# Altium footprint library MOLEX THD.PcbLib: 57 footprints (part 4 of 4)
Each footprint in its own frame and in the unit in brackets; x right, y up, seen from the top. Pads: shape width x height; smd on the part's side, far side on the other; paste and mask are expansions set on the pad; w line width, h text height; cw(c..) or ccw(c..) is an arc to the next point about the centre after c.
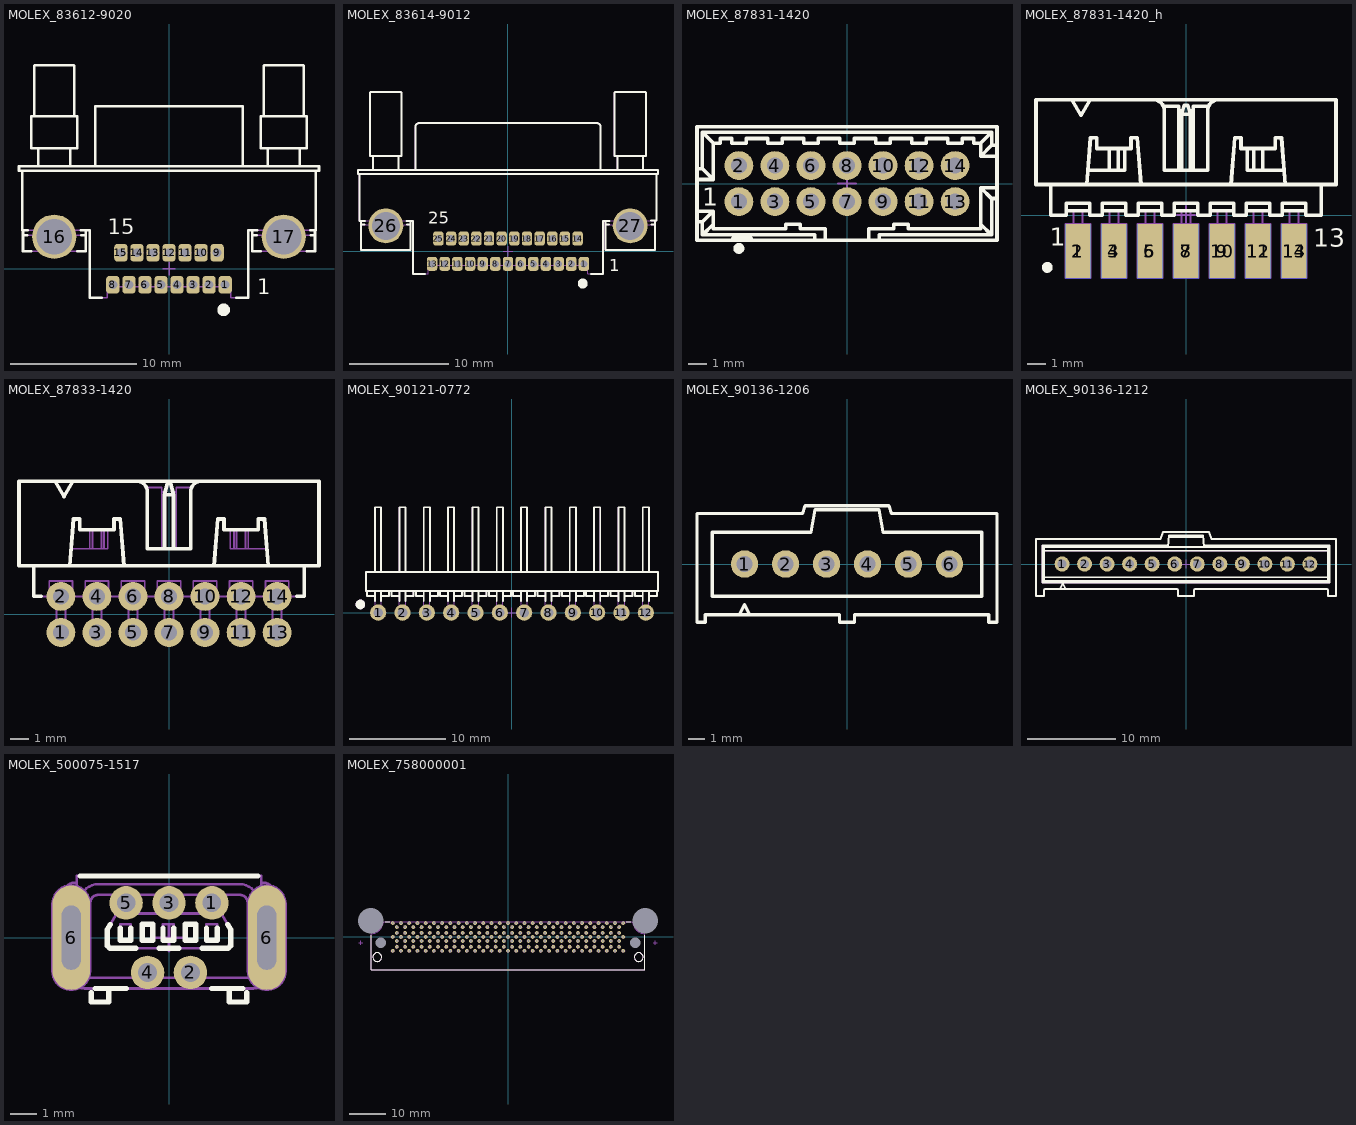
[diagram p3: the footprints below, top view; thin cyan lines are the x and y axes]

## MOLEX_83612-9020 [mm] "1.27mm Pitch Commercial Micro D, PCB Mount, Right Angle Plug, 15 Circuits"
height 7.82
pads (17):
  rrect50% 1.05x1.4 hole 0.7: 1(4.445,-1.27) 2(3.175,-1.27) 3(1.905,-1.27) 4(0.635,-1.27) 5(-0.635,-1.27) 6(-1.905,-1.27) 7(-3.175,-1.27) 8(-4.445,-1.27) 9(3.81,1.27) 10(2.54,1.27) 11(1.27,1.27) 12(0,1.27) 13(-1.27,1.27) 14(-2.54,1.27) 15(-3.81,1.27)
  round 3.5 hole 2.8: 16(-9.08,2.54) 17(9.08,2.54)
Top Overlay:
  circle w0.5: c4.325,-3.25 r0.25
  lines w0.2: -11.621,7.747 -11.621,3.048 -11.169,3.048 ; -11.557,2.667 -11.226,2.667 ; -11.557,3.048 -11.557,1.397 -10.901,1.397 ; -10.668,12.065 -10.668,16.053 -10.592,16.129 -7.569,16.129 -7.493,16.053 -7.493,12.065 ; -10.351,8.128 -10.351,9.525 ; -7.811,8.128 -7.811,9.525 ; -7.259,1.397 -6.604,1.397 -6.604,3.048 ; -6.991,3.048 -6.287,3.048 -6.287,-2.286 -5.32,-2.286 ; -6.934,2.667 -6.604,2.667 ; -5.842,8.128 -5.842,12.852 5.842,12.852 5.842,8.128 ; 5.32,-2.286 6.287,-2.286 6.287,3.048 6.991,3.048 ; 6.604,2.667 6.934,2.667 ; 6.604,3.048 6.604,1.397 7.259,1.397 ; 7.493,12.065 7.493,16.053 7.569,16.129 10.592,16.129 10.668,16.053 10.668,12.065 ; 7.811,8.128 7.811,9.525 ; 10.351,8.128 10.351,9.525 ; 10.901,1.397 11.557,1.397 11.557,3.048 ; 11.169,3.048 11.621,3.048 11.621,7.747 ; 11.226,2.667 11.557,2.667 ; -11.875,7.747 11.875,7.747 11.875,8.128 -11.875,8.128 -11.875,7.747 ; -10.914,9.525 -7.247,9.525 -7.247,12.065 -10.914,12.065 -10.914,9.525 ; 7.247,9.525 10.914,9.525 10.914,12.065 7.247,12.065 7.247,9.525
  text "15" at -4.85,2.735 h1.2
  text "1" at 7,-2.015 h1.2
Mechanical 8:
  lines w0.1: -9.58,2.54 -9.08,2.54 ; -9.08,2.04 -9.08,2.54 ; -9.08,3.04 -9.08,2.54 ; -8.58,2.54 -9.08,2.54 ; -4.945,-1.27 -4.445,-1.27 ; -4.445,-1.77 -4.445,-1.27 ; -4.445,-0.77 -4.445,-1.27 ; -4.31,1.27 -3.81,1.27 ; -3.945,-1.27 -4.445,-1.27 ; -3.81,0.77 -3.81,1.27 ; -3.81,1.77 -3.81,1.27 ; -3.675,-1.27 -3.175,-1.27 ; -3.31,1.27 -3.81,1.27 ; -3.175,-1.77 -3.175,-1.27 ; -3.175,-0.77 -3.175,-1.27 ; -3.04,1.27 -2.54,1.27 ; -2.675,-1.27 -3.175,-1.27 ; -2.54,0.77 -2.54,1.27 ; -2.54,1.77 -2.54,1.27 ; -2.405,-1.27 -1.905,-1.27 ; -2.04,1.27 -2.54,1.27 ; -1.905,-1.77 -1.905,-1.27 ; -1.905,-0.77 -1.905,-1.27 ; -1.77,1.27 -1.27,1.27 ; -1.405,-1.27 -1.905,-1.27 ; -1.27,0.77 -1.27,1.27 ; -1.27,1.77 -1.27,1.27 ; -1.135,-1.27 -0.635,-1.27 ; -0.77,1.27 -1.27,1.27 ; -0.635,-1.77 -0.635,-1.27 ; -0.635,-0.77 -0.635,-1.27 ; -0.5,0 0,0 ; -0.5,1.27 0,1.27 ; -0.135,-1.27 -0.635,-1.27 ; 0,-0.5 0,0 ; 0,0.5 0,0 ; 0,0.77 0,1.27 ; 0,1.77 0,1.27 ; 0.135,-1.27 0.635,-1.27 ; 0.5,0 0,0 ; 0.5,1.27 0,1.27 ; 0.635,-1.77 0.635,-1.27 ; 0.635,-0.77 0.635,-1.27 ; 0.77,1.27 1.27,1.27 ; 1.135,-1.27 0.635,-1.27 ; 1.27,0.77 1.27,1.27 ; 1.27,1.77 1.27,1.27 ; 1.405,-1.27 1.905,-1.27 ; 1.77,1.27 1.27,1.27 ; 1.905,-1.77 1.905,-1.27 ; 1.905,-0.77 1.905,-1.27 ; 2.04,1.27 2.54,1.27 ; 2.405,-1.27 1.905,-1.27 ; 2.54,0.77 2.54,1.27 ; 2.54,1.77 2.54,1.27 ; 2.675,-1.27 3.175,-1.27 ; 3.04,1.27 2.54,1.27 ; 3.175,-1.77 3.175,-1.27 ; 3.175,-0.77 3.175,-1.27 ; 3.31,1.27 3.81,1.27 ; 3.675,-1.27 3.175,-1.27 ; 3.81,0.77 3.81,1.27 ; 3.81,1.77 3.81,1.27 ; 3.945,-1.27 4.445,-1.27 ; 4.31,1.27 3.81,1.27 ; 4.445,-1.77 4.445,-1.27 ; 4.445,-0.77 4.445,-1.27 ; 4.945,-1.27 4.445,-1.27 ; 8.58,2.54 9.08,2.54 ; 9.08,2.04 9.08,2.54 ; 9.08,3.04 9.08,2.54 ; 9.58,2.54 9.08,2.54
Mechanical 14:
  lines w0.1: -11.621,7.747 -11.621,3.048 -6.287,3.048 -6.287,-2.286 -4.89,-2.286 -4.89,-1.422 4.89,-1.422 4.89,-2.286 6.287,-2.286 6.287,3.048 11.621,3.048 11.621,7.747 ; -11.557,2.667 -6.604,2.667 ; -11.557,3.048 -11.557,1.397 -6.604,1.397 -6.604,3.048 ; -10.668,12.065 -10.668,16.053 -10.592,16.129 -7.569,16.129 -7.493,16.053 -7.493,12.065 ; -10.351,8.128 -10.351,9.525 ; -7.811,8.128 -7.811,9.525 ; -5.842,8.128 -5.842,12.852 5.842,12.852 5.842,8.128 ; 6.604,2.667 11.557,2.667 ; 6.604,3.048 6.604,1.397 11.557,1.397 11.557,3.048 ; 7.493,12.065 7.493,16.053 7.569,16.129 10.592,16.129 10.668,16.053 10.668,12.065 ; 7.811,8.128 7.811,9.525 ; 10.351,8.128 10.351,9.525 ; -11.875,7.747 11.875,7.747 11.875,8.128 -11.875,8.128 -11.875,7.747 ; -10.914,9.525 -7.247,9.525 -7.247,12.065 -10.914,12.065 -10.914,9.525 ; 7.247,9.525 10.914,9.525 10.914,12.065 7.247,12.065 7.247,9.525
  text "15" at -4.85,2.735 h1.2
  text "1" at 7,-2.015 h1.2
3D body "MOLEX_83612-9020.stp": height 7.82, standoff -3.02, extent -11.874,-2.286 11.875,16.129

## MOLEX_83614-9012 [mm] "1.27mm Pitch Commercial Micro D, PCB Mount, Right Angle Plug, 25 Circuits"
height 7.82
pads (27):
  rrect50% 1.05x1.4 hole 0.7: 1(7.62,-1.27) 2(6.35,-1.27) 3(5.08,-1.27) 4(3.81,-1.27) 5(2.54,-1.27) 6(1.27,-1.27) 7(0,-1.27) 8(-1.27,-1.27) 9(-2.54,-1.27) 10(-3.81,-1.27) 11(-5.08,-1.27) 12(-6.35,-1.27) 13(-7.62,-1.27) 14(6.985,1.27) 15(5.715,1.27) 16(4.445,1.27) 17(3.175,1.27) 18(1.905,1.27) 19(0.635,1.27) 20(-0.635,1.27) 21(-1.905,1.27) 22(-3.175,1.27) 23(-4.445,1.27) 24(-5.715,1.27) 25(-6.985,1.27)
  round 3.5 hole 2.8: 26(-12.255,2.54) 27(12.255,2.54)
Top Overlay:
  circle w0.5: c7.5,-3.25 r0.25
  lines w0.2: -14.915,7.747 -14.922,3.048 -14.344,3.048 ; -14.732,2.667 -14.401,2.667 ; -14.732,3.048 -14.732,0.127 -9.779,0.127 -9.779,3.048 ; -13.525,8.128 -13.525,9.525 ; -10.985,8.128 -10.985,9.525 ; -10.166,3.048 -9.525,3.048 -9.525,-2.286 -8.348,-2.286 ; -10.109,2.667 -9.779,2.667 ; -9.294,8.128 -9.294,12.471 cw(c-8.913,12.471) -8.913,12.852 8.913,12.852 cw(c8.913,12.471) 9.294,12.471 9.294,8.128 ; 8.348,-2.286 9.525,-2.286 9.525,3.048 10.166,3.05 ; 9.779,2.667 10.109,2.667 ; 9.779,3.048 9.779,0.127 14.732,0.127 14.732,3.048 ; 10.986,8.128 10.986,9.525 ; 13.526,8.128 13.526,9.525 ; 14.341,3.059 14.923,3.061 14.923,7.747 ; 14.401,2.667 14.732,2.667 ; -15.049,7.747 -15.049,8.128 15.05,8.128 15.05,7.747 -15.049,7.747 ; -13.843,9.525 -13.843,15.9 -13.767,15.977 -10.744,15.977 -10.668,15.9 -10.668,9.525 -13.843,9.525 ; 10.668,9.525 10.668,15.9 10.744,15.977 13.767,15.977 13.843,15.9 13.843,9.525 10.668,9.525
  text "1" at 10.175,-2.015 h1.2
  text "25" at -8.025,2.735 h1.2
Mechanical 8:
  lines w0.1: -12.755,2.54 -12.255,2.54 ; -12.255,2.04 -12.255,2.54 ; -12.255,3.04 -12.255,2.54 ; -11.755,2.54 -12.255,2.54 ; -8.12,-1.27 -7.62,-1.27 ; -7.62,-1.77 -7.62,-1.27 ; -7.62,-0.77 -7.62,-1.27 ; -7.485,1.27 -6.985,1.27 ; -7.12,-1.27 -7.62,-1.27 ; -6.985,0.77 -6.985,1.27 ; -6.985,1.77 -6.985,1.27 ; -6.85,-1.27 -6.35,-1.27 ; -6.485,1.27 -6.985,1.27 ; -6.35,-1.77 -6.35,-1.27 ; -6.35,-0.77 -6.35,-1.27 ; -6.215,1.27 -5.715,1.27 ; -5.85,-1.27 -6.35,-1.27 ; -5.715,0.77 -5.715,1.27 ; -5.715,1.77 -5.715,1.27 ; -5.58,-1.27 -5.08,-1.27 ; -5.215,1.27 -5.715,1.27 ; -5.08,-1.77 -5.08,-1.27 ; -5.08,-0.77 -5.08,-1.27 ; -4.945,1.27 -4.445,1.27 ; -4.58,-1.27 -5.08,-1.27 ; -4.445,0.77 -4.445,1.27 ; -4.445,1.77 -4.445,1.27 ; -4.31,-1.27 -3.81,-1.27 ; -3.945,1.27 -4.445,1.27 ; -3.81,-1.77 -3.81,-1.27 ; -3.81,-0.77 -3.81,-1.27 ; -3.675,1.27 -3.175,1.27 ; -3.31,-1.27 -3.81,-1.27 ; -3.175,0.77 -3.175,1.27 ; -3.175,1.77 -3.175,1.27 ; -3.04,-1.27 -2.54,-1.27 ; -2.675,1.27 -3.175,1.27 ; -2.54,-1.77 -2.54,-1.27 ; -2.54,-0.77 -2.54,-1.27 ; -2.405,1.27 -1.905,1.27 ; -2.04,-1.27 -2.54,-1.27 ; -1.905,0.77 -1.905,1.27 ; -1.905,1.77 -1.905,1.27 ; -1.77,-1.27 -1.27,-1.27 ; -1.405,1.27 -1.905,1.27 ; -1.27,-1.77 -1.27,-1.27 ; -1.27,-0.77 -1.27,-1.27 ; -1.135,1.27 -0.635,1.27 ; -0.77,-1.27 -1.27,-1.27 ; -0.635,0.77 -0.635,1.27 ; -0.635,1.77 -0.635,1.27 ; -0.5,-1.27 0,-1.27 ; -0.5,0 0,0 ; -0.135,1.27 -0.635,1.27 ; 0,-1.77 0,-1.27 ; 0,-0.77 0,-1.27 ; 0,-0.5 0,0 ; 0,0.5 0,0 ; 0.135,1.27 0.635,1.27 ; 0.5,-1.27 0,-1.27 ; 0.5,0 0,0 ; 0.635,0.77 0.635,1.27 ; 0.635,1.77 0.635,1.27 ; 0.77,-1.27 1.27,-1.27 ; 1.135,1.27 0.635,1.27 ; 1.27,-1.77 1.27,-1.27 ; 1.27,-0.77 1.27,-1.27 ; 1.405,1.27 1.905,1.27 ; 1.77,-1.27 1.27,-1.27 ; 1.905,0.77 1.905,1.27 ; 1.905,1.77 1.905,1.27 ; 2.04,-1.27 2.54,-1.27 ; 2.405,1.27 1.905,1.27 ; 2.54,-1.77 2.54,-1.27 ; 2.54,-0.77 2.54,-1.27 ; 2.675,1.27 3.175,1.27 ; 3.04,-1.27 2.54,-1.27 ; 3.175,0.77 3.175,1.27 ; 3.175,1.77 3.175,1.27 ; 3.31,-1.27 3.81,-1.27 ; 3.675,1.27 3.175,1.27 ; 3.81,-1.77 3.81,-1.27 ; 3.81,-0.77 3.81,-1.27 ; 3.945,1.27 4.445,1.27 ; 4.31,-1.27 3.81,-1.27 ; 4.445,0.77 4.445,1.27 ; 4.445,1.77 4.445,1.27 ; 4.58,-1.27 5.08,-1.27 ; 4.945,1.27 4.445,1.27 ; 5.08,-1.77 5.08,-1.27 ; 5.08,-0.77 5.08,-1.27 ; 5.215,1.27 5.715,1.27 ; 5.58,-1.27 5.08,-1.27 ; 5.715,0.77 5.715,1.27 ; 5.715,1.77 5.715,1.27 ; 5.85,-1.27 6.35,-1.27 ; 6.215,1.27 5.715,1.27 ; 6.35,-1.77 6.35,-1.27 ; 6.35,-0.77 6.35,-1.27 ; 6.485,1.27 6.985,1.27 ; 6.85,-1.27 6.35,-1.27 ; 6.985,0.77 6.985,1.27 ; 6.985,1.77 6.985,1.27 ; 7.12,-1.27 7.62,-1.27 ; 7.485,1.27 6.985,1.27 ; 7.62,-1.77 7.62,-1.27 ; 7.62,-0.77 7.62,-1.27 ; 8.12,-1.27 7.62,-1.27 ; 11.755,2.54 12.255,2.54 ; 12.255,2.04 12.255,2.54 ; 12.255,3.04 12.255,2.54 ; 12.755,2.54 12.255,2.54
Mechanical 14:
  lines w0.1: -14.915,7.747 -14.922,3.048 -9.525,3.048 -9.525,-2.286 -8.001,-2.286 -8.001,-1.422 8.001,-1.422 8.001,-2.286 9.525,-2.286 9.525,3.048 14.923,3.061 14.923,7.747 ; -14.732,2.667 -9.779,2.667 ; -14.732,3.048 -14.732,0.127 -9.779,0.127 -9.779,3.048 ; -13.525,8.128 -13.525,9.525 ; -10.985,8.128 -10.985,9.525 ; -9.294,8.128 -9.294,12.471 cw(c-8.913,12.471) -8.913,12.852 8.913,12.852 cw(c8.913,12.471) 9.294,12.471 9.294,8.128 ; 9.779,2.667 14.732,2.667 ; 9.779,3.048 9.779,0.127 14.732,0.127 14.732,3.048 ; 10.986,8.128 10.986,9.525 ; 13.526,8.128 13.526,9.525 ; -15.049,7.747 -15.049,8.128 15.05,8.128 15.05,7.747 -15.049,7.747 ; -13.843,9.525 -13.843,15.9 -13.767,15.977 -10.744,15.977 -10.668,15.9 -10.668,9.525 -13.843,9.525 ; 10.668,9.525 10.668,15.9 10.744,15.977 13.767,15.977 13.843,15.9 13.843,9.525 10.668,9.525
  text "1" at 10.175,-2.015 h1.2
  text "25" at -8.025,2.735 h1.2
3D body "MOLEX_83614-9012.stp": height 7.68, standoff -3.18, extent -15.049,-2.286 15.05,15.977

## MOLEX_87831-1420 [mm] "2.00mm (.079\") Pitch Milli-Grid™ Header, Vertical, Shrouded, Center Polarization Slot, Locking Window, 14 Circuits"
height 6.4
pads (14):
  round 1.6 hole 0.9: 1(-6,-1) 2(-6,1) 3(-4,-1) 4(-4,1) 5(-2,-1) 6(-2,1) 7(0,-1) 8(0,1) 9(2,-1) 10(2,1) 11(4,-1) 12(4,1) 13(6,-1) 14(6,1)
Top Overlay:
  circle w0.3: c-6,-3.6 r0.15
  lines w0.2: -8.325,-2.125 -8.025,-2.125 ; -8.325,-1.525 -7.425,-1.525 ; -8.325,0.225 -7.425,0.225 ; -8.325,0.825 -8.025,0.825 ; -7.425,-2.25 -8.025,-2.85 ; -6.325,-3.15 -6.325,-3.05 -5.325,-3.05 -5.325,-3.15 ; -1.8,-3.15 -1.8,-2.85 -8.025,-2.85 ; -1.2,-3.15 -1.2,-2.497 -2.6,-2.497 -2.6,-2.25 -3.4,-2.25 -3.4,-2.5 -7.425,-2.5 -7.425,-1.525 ; 1.2,-3.15 1.2,-2.497 2.6,-2.497 2.6,-2.25 3.4,-2.25 3.4,-2.5 7.425,-2.5 7.425,-0.225 ; 1.8,-3.15 1.8,-2.85 8.025,-2.85 ; 7.425,-2.25 8.025,-2.85 ; 8.325,-0.825 8.025,-0.825 ; 8.325,-0.225 7.425,-0.225 ; 8.325,1.525 7.425,1.525 ; 8.325,2.125 8.025,2.125 ; -8.025,-2.85 -8.025,-2.125 ; -8.025,-2.125 -7.425,-1.525 ; -8.025,0.825 -8.025,2.85 ; -8.025,0.825 -7.425,0.225 ; -8.025,2.85 8.025,2.85 ; -8.025,2.85 -7.425,2.25 ; -7.425,0.225 -7.425,2.25 ; -7.425,2.25 -7.025,2.25 -7.025,2.5 -6.4,2.5 -6.4,2.25 -5.6,2.25 -5.6,2.5 -4.4,2.5 -4.4,2.25 -3.6,2.25 -3.6,2.5 -2.4,2.5 -2.4,2.25 -1.6,2.25 -1.6,2.5 -0.4,2.5 -0.4,2.25 0.4,2.25 0.4,2.5 1.6,2.5 1.6,2.25 2.4,2.25 2.4,2.5 3.6,2.5 3.6,2.25 4.4,2.25 4.4,2.5 5.6,2.5 5.6,2.25 6.4,2.25 6.4,2.5 7.025,2.5 7.025,2.25 7.425,2.25 ; 7.425,-0.225 8.025,-0.825 ; 7.425,1.525 7.425,2.25 ; 7.425,1.525 8.025,2.125 ; 7.425,2.25 8.025,2.85 ; 8.025,-2.85 8.025,-0.825 ; 8.025,2.125 8.025,2.85 ; -8.325,-3.15 8.325,-3.15 8.325,3.15 -8.325,3.15 -8.325,-3.15
  text "1" at -8.032,-1.229 h1.02
Mechanical 8:
  lines w0.1: -6.5,-1 -6,-1 ; -6.5,1 -6,1 ; -6,-1.5 -6,-1 ; -6,-0.5 -6,-1 ; -6,0.5 -6,1 ; -6,1.5 -6,1 ; -5.5,-1 -6,-1 ; -5.5,1 -6,1 ; -4.5,-1 -4,-1 ; -4.5,1 -4,1 ; -4,-1.5 -4,-1 ; -4,-0.5 -4,-1 ; -4,0.5 -4,1 ; -4,1.5 -4,1 ; -3.5,-1 -4,-1 ; -3.5,1 -4,1 ; -2.5,-1 -2,-1 ; -2.5,1 -2,1 ; -2,-1.5 -2,-1 ; -2,-0.5 -2,-1 ; -2,0.5 -2,1 ; -2,1.5 -2,1 ; -1.5,-1 -2,-1 ; -1.5,1 -2,1 ; -0.5,-1 0,-1 ; -0.5,0 0,0 ; -0.5,1 0,1 ; 0,-1.5 0,-1 ; 0,1.5 0,1 ; 0.5,-1 0,-1 ; 0.5,0 0,0 ; 0.5,1 0,1 ; 1.5,-1 2,-1 ; 1.5,1 2,1 ; 2,-1.5 2,-1 ; 2,-0.5 2,-1 ; 2,0.5 2,1 ; 2,1.5 2,1 ; 2.5,-1 2,-1 ; 2.5,1 2,1 ; 3.5,-1 4,-1 ; 3.5,1 4,1 ; 4,-1.5 4,-1 ; 4,-0.5 4,-1 ; 4,0.5 4,1 ; 4,1.5 4,1 ; 4.5,-1 4,-1 ; 4.5,1 4,1 ; 5.5,-1 6,-1 ; 5.5,1 6,1 ; 6,-1.5 6,-1 ; 6,-0.5 6,-1 ; 6,0.5 6,1 ; 6,1.5 6,1 ; 6.5,-1 6,-1 ; 6.5,1 6,1 ; 0,-1 0,-0.5 0,0 ; 0,0 0,0.5 0,1
Mechanical 14:
  lines w0.1: -8.325,-2.125 -8.025,-2.125 ; -8.325,-1.525 -7.425,-1.525 ; -8.325,0.225 -7.425,0.225 ; -8.325,0.825 -8.025,0.825 ; -7.425,-2.25 -8.025,-2.85 ; -6.325,-3.15 -6.325,-3.05 -5.325,-3.05 -5.325,-3.15 ; -1.8,-3.15 -1.8,-2.85 -8.025,-2.85 ; -1.2,-3.15 -1.2,-2.497 -2.6,-2.497 -2.6,-2.25 -3.4,-2.25 -3.4,-2.5 -7.425,-2.5 -7.425,-1.525 ; 1.2,-3.15 1.2,-2.497 2.6,-2.497 2.6,-2.25 3.4,-2.25 3.4,-2.5 7.425,-2.5 7.425,-0.225 ; 1.8,-3.15 1.8,-2.85 8.025,-2.85 ; 7.425,-2.25 8.025,-2.85 ; 8.325,-0.825 8.025,-0.825 ; 8.325,-0.225 7.425,-0.225 ; 8.325,1.525 7.425,1.525 ; 8.325,2.125 8.025,2.125 ; -8.025,-2.85 -8.025,-2.125 ; -8.025,-2.125 -7.425,-1.525 ; -8.025,0.825 -8.025,2.85 ; -8.025,0.825 -7.425,0.225 ; -8.025,2.85 8.025,2.85 ; -8.025,2.85 -7.425,2.25 ; -7.425,0.225 -7.425,2.25 ; -7.425,2.25 -7.025,2.25 -7.025,2.5 -6.4,2.5 -6.4,2.25 -5.6,2.25 -5.6,2.5 -4.4,2.5 -4.4,2.25 -3.6,2.25 -3.6,2.5 -2.4,2.5 -2.4,2.25 -1.6,2.25 -1.6,2.5 -0.4,2.5 -0.4,2.25 0.4,2.25 0.4,2.5 1.6,2.5 1.6,2.25 2.4,2.25 2.4,2.5 3.6,2.5 3.6,2.25 4.4,2.25 4.4,2.5 5.6,2.5 5.6,2.25 6.4,2.25 6.4,2.5 7.025,2.5 7.025,2.25 7.425,2.25 ; 7.425,-0.225 8.025,-0.825 ; 7.425,1.525 7.425,2.25 ; 7.425,1.525 8.025,2.125 ; 7.425,2.25 8.025,2.85 ; 8.025,-2.85 8.025,-0.825 ; 8.025,2.125 8.025,2.85 ; -8.325,-3.15 8.325,-3.15 8.325,3.15 -8.325,3.15 -8.325,-3.15 ; -6.25,-1.25 -5.75,-1.25 -5.75,-0.75 -6.25,-0.75 -6.25,-1.25 ; -6.25,0.75 -5.75,0.75 -5.75,1.25 -6.25,1.25 -6.25,0.75 ; -4.25,-1.25 -3.75,-1.25 -3.75,-0.75 -4.25,-0.75 -4.25,-1.25 ; -4.25,0.75 -3.75,0.75 -3.75,1.25 -4.25,1.25 -4.25,0.75 ; -2.25,-1.25 -1.75,-1.25 -1.75,-0.75 -2.25,-0.75 -2.25,-1.25 ; -2.25,0.75 -1.75,0.75 -1.75,1.25 -2.25,1.25 -2.25,0.75 ; -0.25,-1.25 0.25,-1.25 0.25,-0.75 -0.25,-0.75 -0.25,-1.25 ; -0.25,0.75 0.25,0.75 0.25,1.25 -0.25,1.25 -0.25,0.75 ; 1.75,-1.25 2.25,-1.25 2.25,-0.75 1.75,-0.75 1.75,-1.25 ; 1.75,0.75 2.25,0.75 2.25,1.25 1.75,1.25 1.75,0.75 ; 3.75,-1.25 4.25,-1.25 4.25,-0.75 3.75,-0.75 3.75,-1.25 ; 3.75,0.75 4.25,0.75 4.25,1.25 3.75,1.25 3.75,0.75 ; 5.75,-1.25 6.25,-1.25 6.25,-0.75 5.75,-0.75 5.75,-1.25 ; 5.75,0.75 6.25,0.75 6.25,1.25 5.75,1.25 5.75,0.75
  text "1" at -8.032,-1.229 h1.02
3D body "MOLEX_87831-1420.stp": height 6.4, standoff -2.5, extent -8.325,-3.15 8.325,3.15

## MOLEX_87831-1420_h [mm] "2.00mm (.079\") Pitch Milli-Grid™ Header, Vertical, Shrouded, Center Polarization Slot, Locking Window, 14 Circuits (Customized PCB Edge assembly)"
height 3.15
pads (14):
  rect 1.4x3 smd paste-1.5: 1(-6,-2) 3(-4,-2) 5(-2,-2) 7(0,-2) 9(2,-2) 11(4,-2) 13(6,-2)
  rect 1.4x3 smd far side paste-1.5: 2(-6,-2) 4(-4,-2) 6(-2,-2) 8(0,-2) 10(2,-2) 12(4,-2) 14(6,-2)
Top Overlay:
  circle w0.3: c-7.7,-2.9 r0.15
  lines w0.2: -7.5,1.7 -7.5,0 -6.65,0 -6.65,0.654 -5.35,0.654 -5.35,0 -4.65,0 -4.65,0.654 -3.35,0.654 -3.35,0 -2.65,0 -2.65,0.654 -1.35,0.654 -1.35,0 -0.65,0 -0.65,0.654 0.65,0.654 0.65,0 1.35,0 1.35,0.654 2.65,0.654 2.65,0 3.35,0 3.35,0.654 4.65,0.654 4.65,0 5.35,0 5.35,0.654 6.65,0.654 6.65,0 7.5,0 7.5,1.7 ; -6.65,0.25 -5.35,0.25 ; -6.325,6.4 -5.825,5.534 -5.325,6.4 ; -5.5,1.7 -5.3,4.3 -4.95,4.3 -4.95,3.7 -3.05,3.7 -3.05,4.3 -2.7,4.3 -2.5,1.7 ; -5.438,2.5 -3.4,2.5 -3.4,3.7 -4.25,3.7 -4.25,2.5 ; -4.65,0.25 -3.35,0.25 ; -3.75,2.5 -3.75,3.7 ; -2.65,0.25 -1.35,0.25 ; -1.8,6.4 cw(c-1.8,5.8) -1.2,5.8 -1.2,2.5 ; -1.255,6.05 -0.4,6.05 -0.4,2.5 ; -0.65,0.25 0.65,0.25 ; -0.4,5.8 -0.19,5.8 ; -0.25,2.5 -0.25,5.6 ; 0.19,5.8 0.4,5.8 ; 0.25,2.5 0.25,5.6 ; 0.4,2.5 0.4,6.05 1.255,6.05 ; 1.35,0.25 2.65,0.25 ; 1.8,6.4 ccw(c1.8,5.8) 1.2,5.8 1.2,2.5 ; 2.5,1.7 2.7,4.3 3.05,4.3 3.05,3.7 4.95,3.7 4.95,4.3 5.3,4.3 5.5,1.7 ; 3.35,0.25 4.65,0.25 ; 3.75,2.5 3.75,3.7 ; 4.25,2.5 4.25,3.7 3.4,3.7 3.4,2.5 5.438,2.5 ; 5.35,0.25 6.65,0.25 ; -1.2,2.5 1.2,2.5 ; -1.2,2.5 1.2,2.5 ; -0.25,5.6 -0.1,6.1 0.1,6.1 0.25,5.6 ; -0.25,5.6 0.25,5.6 ; -8.325,1.7 -8.325,6.4 8.325,6.4 8.325,1.7 -8.325,1.7
  text "13" at 7.05,-1.75 h1.02
  text "1" at -7.55,-1.7 h1.02
Bottom Overlay:
  text "14" at 8.5,-1.7 h1.02
  text "2" at -7,-1.7 h1.02
Mechanical 8:
  lines w0.1: -6.5,-2 -6,-2 ; -6,-2.5 -6,-2 ; -6,-1.5 -6,-2 ; -5.5,-2 -6,-2 ; -4.5,-2 -4,-2 ; -4,-2.5 -4,-2 ; -4,-1.5 -4,-2 ; -3.5,-2 -4,-2 ; -2.5,-2 -2,-2 ; -2,-2.5 -2,-2 ; -2,-1.5 -2,-2 ; -1.5,-2 -2,-2 ; -0.5,-2 0,-2 ; -0.5,0 0,0 ; 0,-2.5 0,-2 ; 0,-1.5 0,-2 ; 0,-0.5 0,0 ; 0,0.5 0,0 ; 0.5,-2 0,-2 ; 0.5,0 0,0 ; 1.5,-2 2,-2 ; 2,-2.5 2,-2 ; 2,-1.5 2,-2 ; 2.5,-2 2,-2 ; 3.5,-2 4,-2 ; 4,-2.5 4,-2 ; 4,-1.5 4,-2 ; 4.5,-2 4,-2 ; 5.5,-2 6,-2 ; 6,-2.5 6,-2 ; 6,-1.5 6,-2 ; 6.5,-2 6,-2 ; -6.7,-3.5 -5.3,-3.5 -5.3,-0.5 -6.7,-0.5 -6.7,-3.5 ; -4.7,-3.5 -3.3,-3.5 -3.3,-0.5 -4.7,-0.5 -4.7,-3.5 ; -2.7,-3.5 -1.3,-3.5 -1.3,-0.5 -2.7,-0.5 -2.7,-3.5 ; -0.7,-3.5 0.7,-3.5 0.7,-0.5 -0.7,-0.5 -0.7,-3.5 ; 1.3,-3.5 2.7,-3.5 2.7,-0.5 1.3,-0.5 1.3,-3.5 ; 3.3,-3.5 4.7,-3.5 4.7,-0.5 3.3,-0.5 3.3,-3.5 ; 5.3,-3.5 6.7,-3.5 6.7,-0.5 5.3,-0.5 5.3,-3.5
Mechanical 14:
  lines w0.1: -7.5,1.7 -7.5,0 -6.65,0 -6.65,0.654 -5.35,0.654 -5.35,0 -4.65,0 -4.65,0.654 -3.35,0.654 -3.35,0 -2.65,0 -2.65,0.654 -1.35,0.654 -1.35,0 -0.65,0 -0.65,0.654 0.65,0.654 0.65,0 1.35,0 1.35,0.654 2.65,0.654 2.65,0 3.35,0 3.35,0.654 4.65,0.654 4.65,0 5.35,0 5.35,0.654 6.65,0.654 6.65,0 7.5,0 7.5,1.7 ; -6.65,0.25 -5.35,0.25 ; -6.325,6.4 -5.825,5.534 -5.325,6.4 ; -6.25,0.25 -6.25,-2 ; -5.75,0.25 -5.75,-2 ; -5.5,1.7 -5.3,4.3 -4.95,4.3 -4.95,3.7 -3.05,3.7 -3.05,4.3 -2.7,4.3 -2.5,1.7 ; -5.438,2.5 -3.4,2.5 -3.4,3.7 -4.25,3.7 -4.25,2.5 ; -4.65,0.25 -3.35,0.25 ; -4.25,0.25 -4.25,-2 ; -3.75,0.25 -3.75,-2 ; -3.75,2.5 -3.75,3.7 ; -2.65,0.25 -1.35,0.25 ; -2.25,0.25 -2.25,-2 ; -1.8,6.4 cw(c-1.8,5.8) -1.2,5.8 -1.2,2.5 ; -1.75,0.25 -1.75,-2 ; -1.255,6.05 -0.4,6.05 -0.4,2.5 ; -0.65,0.25 0.65,0.25 ; -0.4,5.8 -0.19,5.8 ; -0.25,0.25 -0.25,-2 ; -0.25,2.5 -0.25,5.6 ; 0.19,5.8 0.4,5.8 ; 0.25,0.25 0.25,-2 ; 0.25,2.5 0.25,5.6 ; 0.4,2.5 0.4,6.05 1.255,6.05 ; 1.35,0.25 2.65,0.25 ; 1.75,0.25 1.75,-2 ; 1.8,6.4 ccw(c1.8,5.8) 1.2,5.8 1.2,2.5 ; 2.25,0.25 2.25,-2 ; 2.5,1.7 2.7,4.3 3.05,4.3 3.05,3.7 4.95,3.7 4.95,4.3 5.3,4.3 5.5,1.7 ; 3.35,0.25 4.65,0.25 ; 3.75,0.25 3.75,-2 ; 3.75,2.5 3.75,3.7 ; 4.25,0.25 4.25,-2 ; 4.25,2.5 4.25,3.7 3.4,3.7 3.4,2.5 5.438,2.5 ; 5.35,0.25 6.65,0.25 ; 5.75,0.25 5.75,-2 ; 6.25,0.25 6.25,-2 ; -6.25,-2 -5.75,-2 ; -6.25,-2 -6.1,-2.5 -5.9,-2.5 -5.75,-2 ; -4.25,-2 -3.75,-2 ; -4.25,-2 -4.1,-2.5 -3.9,-2.5 -3.75,-2 ; -2.25,-2 -1.75,-2 ; -2.25,-2 -2.1,-2.5 -1.9,-2.5 -1.75,-2 ; -1.2,2.5 1.2,2.5 ; -1.2,2.5 1.2,2.5 ; -0.25,-2 0.25,-2 ; -0.25,-2 -0.1,-2.5 0.1,-2.5 0.25,-2 ; -0.25,5.6 -0.1,6.1 0.1,6.1 0.25,5.6 ; -0.25,5.6 0.25,5.6 ; 1.75,-2 2.25,-2 ; 1.75,-2 1.9,-2.5 2.1,-2.5 2.25,-2 ; 3.75,-2 4.25,-2 ; 3.75,-2 3.9,-2.5 4.1,-2.5 4.25,-2 ; 5.75,-2 6.25,-2 ; 5.75,-2 5.9,-2.5 6.1,-2.5 6.25,-2 ; -8.325,1.7 -8.325,6.4 8.325,6.4 8.325,1.7 -8.325,1.7